# Altium footprint library pcb2D3D库101.PcbLib: 411 footprints (part 2 of 26)
Each footprint in its own frame and in the unit in brackets; x right, y up, seen from the top. Pads: shape width x height; smd on the part's side, far side on the other; paste and mask are expansions set on the pad; w line width, h text height; cw(c..) or ccw(c..) is an arc to the next point about the centre after c.
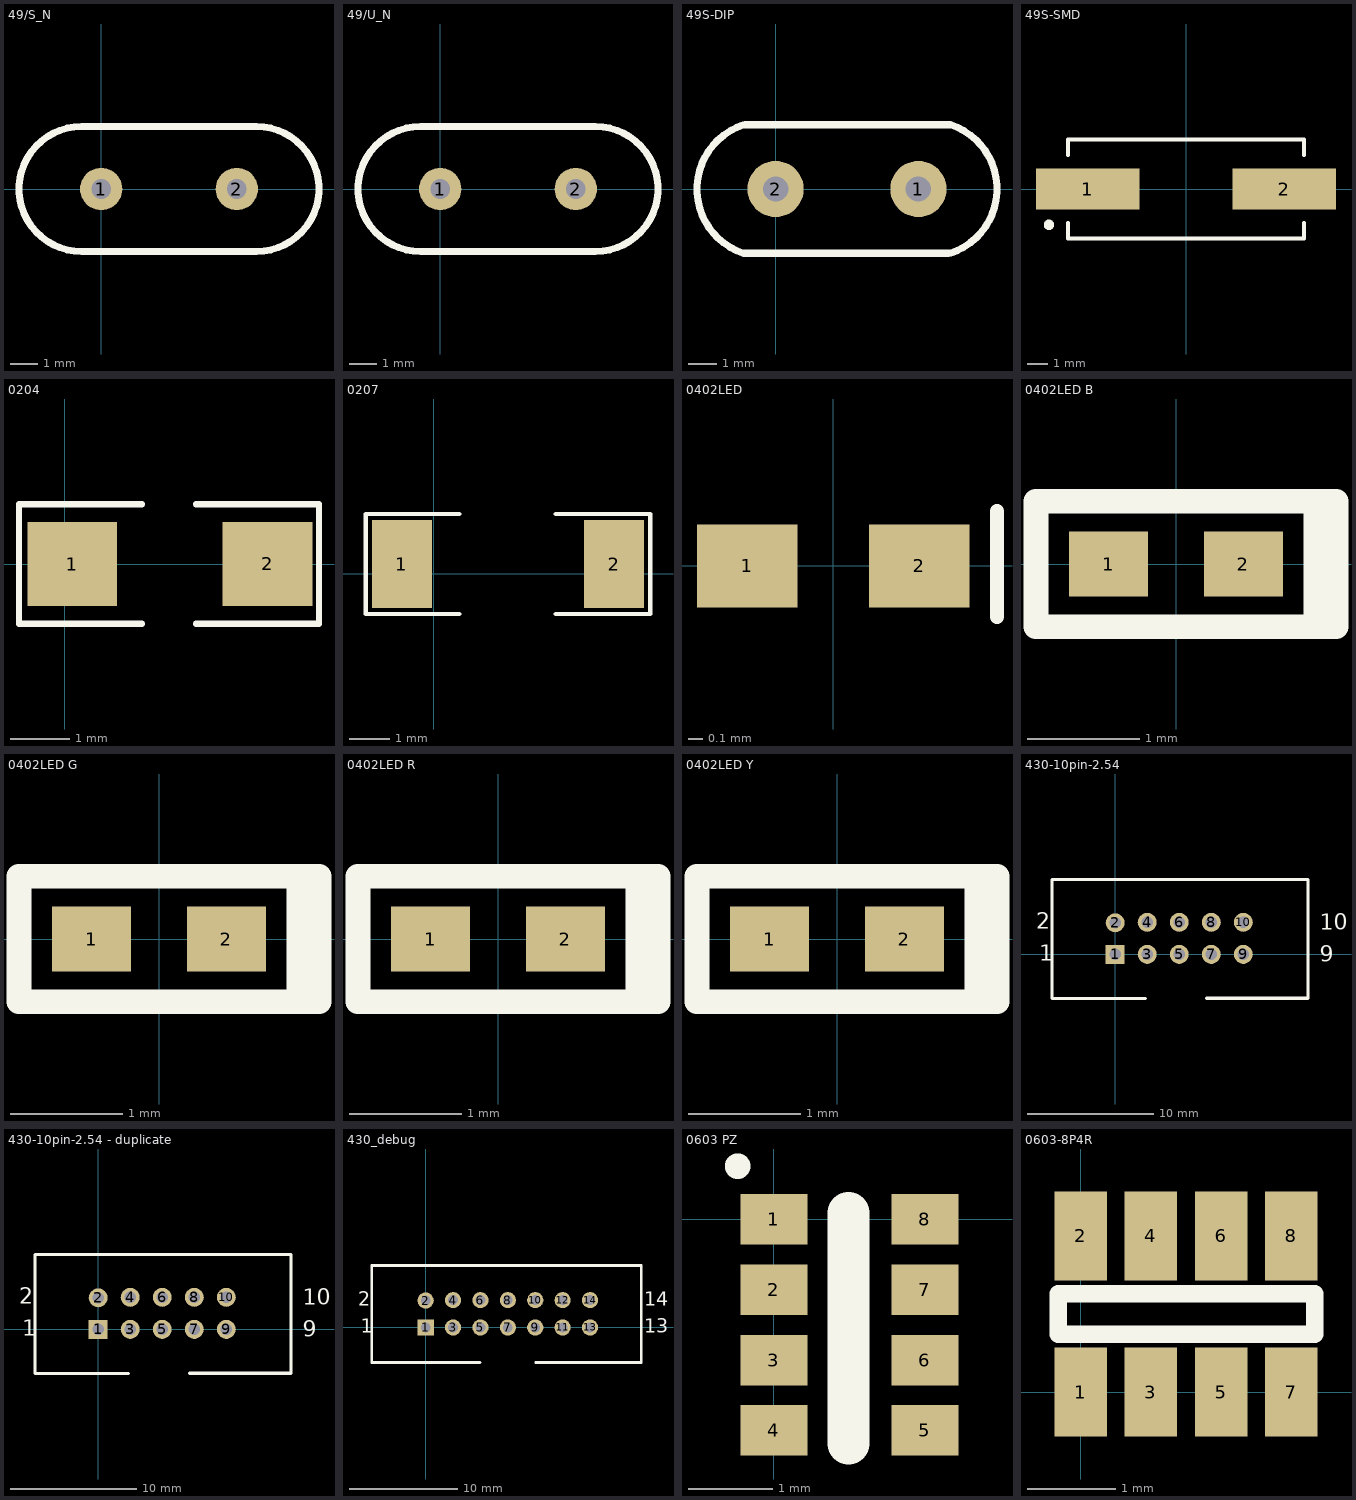
[diagram p1: the footprints below, top view; thin cyan lines are the x and y axes]

## 49/S_N [mil] "短型晶振（未加焊）"
pads (2):
  round 60 hole 28: 1(0,0) 2(192,0)
TopOverlay:
  lines w10: -28,-88.5 cw(c-28,0) -28,88.5 220,88.5 cw(c220,0) 220,-88.5 -28,-88.5
3D body "hc-49s_n.stp": height 137.8, standoff -118.11, extent -116.14,-89.37 309.06,87.8

## 49/U_N [mil] "高型晶振（未加焊）"
pads (2):
  round 60 hole 28: 1(0,0) 2(192,0)
TopOverlay:
  lines w10: -28,-88.5 cw(c-28,0) -28,88.5 220,88.5 cw(c220,0) 220,-88.5 -28,-88.5
3D body "hc-49u_n.stp": height 511.81, standoff -118.11, extent -116.54,-88.39 308.66,88.78

## 49S-DIP [mm]
pads (2):
  round 2 hole 0.9: 1(5.08,0) 2(0,0)
TopOverlay:
  lines w0.254: -1.144,-2.289 cw(c-0.391,-0.003) -1.142,2.283 ; -1.143,-2.286 6.144,-2.286 ; -1.09,2.286 6.223,2.286 ; 6.222,-2.283 ccw(c5.471,0.003) 6.224,2.289
3D body "SW3dPS-HP49US.STEP": height 3.5, standoff -4, extent -3.092,-2.331 8.258,2.319

## 49S-SMD [mm]
pads (2):
  rect 5x2 smd: 1(-4.75,0) 2(4.75,0)
TopOverlay:
  circle w0.25: c-6.625,-1.73 r0.125
  lines w0.2: -5.7,-1.65 -5.7,-2.4 5.7,-2.4 5.7,-1.65 ; -5.7,1.65 -5.7,2.4 5.7,2.4 5.7,1.65
3D body "User Library-hc49_cystal.STEP": height 4, standoff 0, extent -6.7,-2.462 6.7,2.438

## 0204 [mm]
height 0.6
pads (2):
  rect 1.5x1.4 smd: 1(0.127,0) 2(3.4,0)
TopOverlay:
  lines w0.102: 1.3,-1 -0.762,-1 -0.762,1 1.3,1 ; 2.2,-1 4.262,-1 4.262,1 2.2,1
3D body "Melf_0204.STEP": height 1.4, standoff 0, extent 0.078,-0.711 3.478,0.689

## 0207 [mm]
height 0.6
pads (2):
  rect 1.5x2.2 smd: 1(-0.796,0.246) 2(4.504,0.246)
TopOverlay:
  lines w0.102: 0.635,-1 -1.702,-1 -1.702,1.499 0.635,1.499 ; 3.048,-1 5.41,-1 5.41,1.499 3.048,1.499
3D body "R0207.STEP": height 2.2, standoff 0, extent -0.796,-0.854 4.504,1.346

## 0402LED [mm]
pads (2):
  rect 0.7x0.58 smd: 1(-0.6,0) 2(0.6,0)
TopOverlay:
  lines w0.1: 1.143,-0.356 1.143,0.381
3D body "User Library-led_0402LED0402 green.STEP": height 0.45, standoff 0, extent -0.505,-0.25 0.505,0.25

## 0402LED B [mm]
pads (2):
  rect 0.7x0.58 smd: 1(-0.6,0) 2(0.6,0)
TopOverlay:
  lines w0.22: 1.245,-0.559 1.245,0.559 ; 1.245,-0.559 1.422,-0.559 1.422,0.559 1.245,0.559 ; 1.245,-0.559 1.245,0.559 ; 1.245,-0.559 -1.245,-0.559 -1.245,0.559 1.245,0.559
3D body "User Library-led_0402LED0402 blue.STEP": height 0.45, standoff 0, extent -0.505,-0.25 0.505,0.25

## 0402LED G [mm]
pads (2):
  rect 0.7x0.58 smd: 1(-0.6,0) 2(0.6,0)
TopOverlay:
  lines w0.22: 1.245,-0.559 -1.245,-0.559 -1.245,0.559 1.245,0.559 ; 1.245,-0.559 1.245,0.559 ; 1.245,-0.559 1.245,0.559 ; 1.245,-0.559 1.422,-0.559 1.422,0.559 1.245,0.559 ; 1.245,-0.559 1.245,0.559
3D body "User Library-led_0402LED0402 green.STEP": height 0.45, standoff 0, extent -0.505,-0.25 0.505,0.25

## 0402LED R [mm]
pads (2):
  rect 0.7x0.58 smd: 1(-0.6,0) 2(0.6,0)
TopOverlay:
  lines w0.22: 1.245,-0.559 1.422,-0.559 1.422,0.559 1.245,0.559 ; 1.245,-0.559 -1.245,-0.559 -1.245,0.559 1.245,0.559 ; 1.245,-0.559 1.245,0.559
3D body "User Library-led_0402.STEP": height 0.45, standoff 0, extent -0.505,-0.25 0.505,0.25

## 0402LED Y [mm]
pads (2):
  rect 0.7x0.58 smd: 1(-0.6,0) 2(0.6,0)
TopOverlay:
  lines w0.22: 1.245,-0.559 1.245,0.559 ; 1.245,-0.559 -1.245,-0.559 -1.245,0.559 1.245,0.559 ; 1.245,-0.559 1.422,-0.559 1.422,0.559 1.245,0.559 ; 1.245,-0.559 1.245,0.559
3D body "User Library-led_0402LED0402 yellow.STEP": height 0.45, standoff 0, extent -0.505,-0.25 0.505,0.25

## 430-10pin-2.54 [mm] "牛角座"
pads (10):
  rect 1.5x1.5 hole 0.9: 1(0,0)
  round 1.5 hole 0.9: 2(0,2.5) 3(2.54,0) 4(2.54,2.54) 5(5.08,0) 6(5.08,2.54) 7(7.62,0) 8(7.62,2.54) 9(10.16,0) 10(10.16,2.54)
TopOverlay:
  lines w0.254: 2.388,-3.505 -5,-3.505 -5,5.944 15.291,5.944 15.291,-3.48 7.264,-3.48
  text "9" at 16.233,-0.584 h1.27
  text "10" at 16.233,1.956 h1.27
  text "1" at -6,-0.5 h1.27
  text "2" at -6.274,2.032 h1.27
3D body "Header 2_54mm 10 Pin.step": height 9.86, standoff -3.05, extent -5.055,-3.353 15.265,5.791

## 430-10pin-2.54 - duplicate [mm] "牛角座"
pads (10):
  rect 1.5x1.5 hole 0.9: 1(0,0)
  round 1.5 hole 0.9: 2(0,2.5) 3(2.54,0) 4(2.54,2.54) 5(5.08,0) 6(5.08,2.54) 7(7.62,0) 8(7.62,2.54) 9(10.16,0) 10(10.16,2.54)
TopOverlay:
  lines w0.254: 2.388,-3.505 -5,-3.505 -5,5.944 15.291,5.944 15.291,-3.48 7.264,-3.48
  text "2" at -6.274,2.032 h1.27
  text "1" at -6,-0.5 h1.27
  text "10" at 16.233,1.956 h1.27
  text "9" at 16.233,-0.584 h1.27
3D body "Header 2_54mm 10 Pin.step": height 9.86, standoff -3.05, extent -5.055,-3.353 15.265,5.791

## 430_debug [mm] "msp430调试接口（未加焊）"
pads (14):
  rect 1.5x1.5 hole 0.9: 1(0,0)
  round 1.5 hole 0.9: 2(0,2.5) 3(2.54,0) 4(2.54,2.54) 5(5.08,0) 6(5.08,2.54) 7(7.62,0) 8(7.62,2.54) 9(10.16,0) 10(10.16,2.54) 11(12.7,0) 12(12.7,2.54) 13(15.24,0) 14(15.24,2.54)
TopOverlay:
  lines w0.254: 5.028,-3.25 -5,-3.25 -5,5.75 20,5.75 20,-3.25 10.212,-3.25
  text "2" at -6.274,2.032 h1.27
  text "1" at -6,-0.5 h1.27
  text "14" at 20.272,2.032 h1.27
  text "13" at 20.272,-0.508 h1.27
3D body "430_debug_n.stp": height 8.67, standoff -3.41, extent -5.05,-3.295 20.29,5.545

## 0603 PZ [mm]
pads (8):
  rect 0.8x0.6 smd: 1(0,0) 2(0,-0.838) 3(0,-1.676) 4(0,-2.514) 5(1.8,-2.514) 6(1.8,-1.676) 7(1.8,-0.838) 8(1.8,0)
TopOverlay:
  circle w0.254: c-0.432,0.635 r0.025
  lines w0.5: 0.889,-2.667 0.889,0.076
3D body "User Library-TC164.STEP": height 0.55, standoff 0, extent 0.089,-2.87 1.689,0.33

## 0603-8P4R [mm]
pads (8):
  rect 0.6x1.016 smd: 1(0,0) 2(0,1.778) 3(0.8,0) 4(0.8,1.778) 5(1.6,0) 6(1.6,1.778) 7(2.4,0) 8(2.4,1.778)
TopOverlay:
  lines w0.2: -0.254,0.66 -0.254,1.118 2.667,1.118 2.667,0.66 -0.254,0.66
3D body "R1206-4R1-1.step": height 0.59, standoff 0.01, extent -0.381,0.102 2.819,1.702